# Altium footprint library tianxiaohua_PcbLib.PcbLib: 138 footprints (part 3 of 9)
Each footprint in its own frame and in the unit in brackets; x right, y up, seen from the top. Pads: shape width x height; smd on the part's side, far side on the other; paste and mask are expansions set on the pad; w line width, h text height; cw(c..) or ccw(c..) is an arc to the next point about the centre after c.
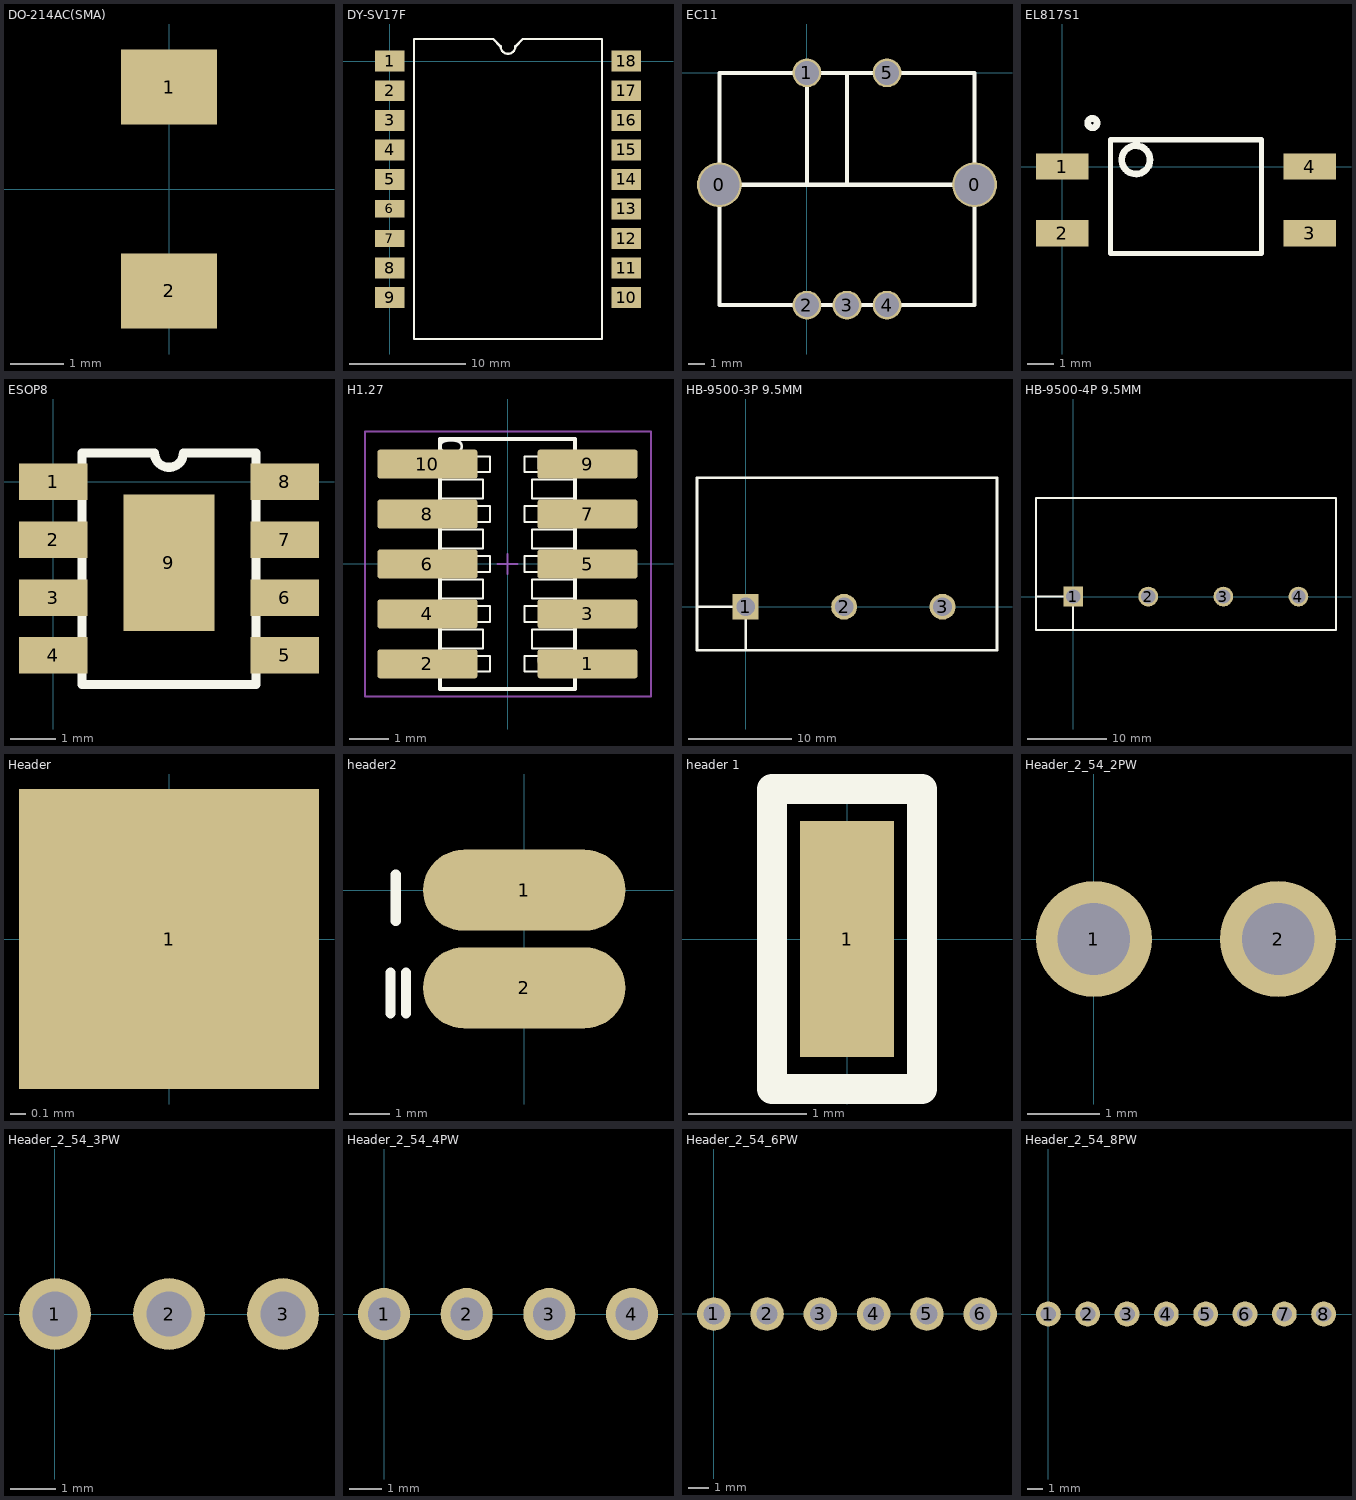
[diagram p2: the footprints below, top view; thin cyan lines are the x and y axes]

## DO-214AC(SMA) [mm]
pads (2):
  rect 1.8x1.4 smd: 1(0,1.905) 2(0,-1.905)
3D body "User Library-DO-214AC SMA.step": height 2.4, standoff 0, extent -1.3,-2.6 1.3,2.6

## DY-SV17F [mm]
pads (18):
  rect 2.5x1.8 smd: 1(0,0) 2(0,-2.54) 3(0,-5.08) 4(0,-7.62) 5(0,-10.16) 8(0,-17.78) 9(0,-20.32) 10(20.32,-20.32) 11(20.32,-17.78) 12(20.32,-15.24) 13(20.32,-12.7) 14(20.32,-10.16) 15(20.32,-7.62) 16(20.32,-5.08) 17(20.32,-2.54) 18(20.32,0)
  rect 2.5x1.5 smd: 6(0,-12.7) 7(0,-15.24)
Top Overlay:
  lines w0.2: 2.085,-23.876 2.085,1.905 8.89,1.905 9.525,1.27 ccw(c10.16,1.27) 10.795,1.27 11.43,1.905 18.235,1.905 18.235,-23.876 2.085,-23.876
3D body: height 2, standoff 0, extent -0.127,-23.876 20.32,2.667

## EC11 [mm]
pads (7):
  round 2.8 hole 2.5: 0(-5.461,-6.985) 0(10.461,-6.985)
  round 1.8 hole 1.5: 1(0,0) 2(0,-14.5) 3(2.5,-14.5) 4(5,-14.5) 5(5,0)
Top Overlay:
  lines w0.254: -5.461,-6.985 2.5,-6.985 ; 0,-6.985 0,0 ; 10.461,-6.985 2.5,-6.985 ; 0,0 -5.461,0 -5.461,-14.5 10.461,-14.5 10.461,0 0,0 ; 0,0 2.5,0 2.5,-6.985
3D body: height 21.5, standoff -2.54, extent -0.058,-9.522 5.011,-4.448
3D body: height 6.7, standoff 0, extent -5.461,-14.5 10.414,0

## EL817S1 [mm]
pads (4):
  rect 2x1 smd: 1(0,0) 2(0,-2.54) 3(9.4,-2.54) 4(9.4,0)
Top Overlay:
  circle w0.254: c1.143,1.651 r0.18
  circle w0.254: c2.794,0.254 r0.539
  lines w0.2: 1.835,-3.302 1.835,1.016 7.565,1.016 7.565,-3.302 1.835,-3.302
3D body: height 3.6, standoff 0, extent 1.651,-3.302 7.747,0.889

## ESOP8 [mm]
pads (9):
  rect 1.5x0.8 smd: 1(0,0) 2(0,-1.27) 3(0,-2.54) 4(0,-3.81) 5(5.081,-3.81) 6(5.081,-2.54) 7(5.081,-1.27) 8(5.081,0)
  rect 2x3 smd: 9(2.54,-1.778)
Top Overlay:
  lines w0.2: 2.159,0.635 0.635,0.635 0.635,-4.445 4.445,-4.445 4.445,0.635 2.921,0.635 ; 2.222,0.635 ccw(c2.54,0.635) 2.857,0.635
3D body "User Library-SOIC_N-R8.STEP": height 1.75, standoff 0, extent -0.56,-4.405 5.64,0.595

## H1.27 [mm]
pads (10):
  rrect20% 2.55x0.74 smd mask+0.051: 1(2.027,-2.542) 2(-2.043,-2.542) 3(2.027,-1.272) 4(-2.043,-1.272) 5(2.027,-0.002) 6(-2.043,-0.002) 7(2.027,1.268) 8(-2.043,1.268) 9(2.027,2.538) 10(-2.043,2.538)
Top Overlay:
  lines w0.05: -1.723,-2.153 -0.628,-2.153 -0.628,-1.672 ; -1.723,-0.883 -0.628,-0.883 -0.628,-0.402 ; -1.723,0.387 -0.628,0.387 -0.628,0.868 ; -1.723,1.657 -0.628,1.657 -0.628,2.138 ; -1.718,-1.662 -0.628,-1.662 ; -1.718,-0.392 -0.628,-0.392 ; -1.718,0.878 -0.628,0.878 ; -1.718,2.148 -0.628,2.148 ; 0.612,-2.153 1.702,-2.153 ; 0.612,-2.143 0.612,-1.662 1.707,-1.662 ; 0.612,-0.883 1.702,-0.883 ; 0.612,-0.873 0.612,-0.392 1.707,-0.392 ; 0.612,0.387 1.702,0.387 ; 0.612,0.397 0.612,0.878 1.707,0.878 ; 0.612,1.657 1.702,1.657 ; 0.612,1.667 0.612,2.148 1.707,2.148 ; -0.848,-2.742 -0.848,-2.342 -0.448,-2.342 -0.448,-2.742 -0.848,-2.742 ; -0.848,-1.472 -0.848,-1.072 -0.448,-1.072 -0.448,-1.472 -0.848,-1.472 ; -0.848,-0.202 -0.448,-0.202 -0.448,0.198 -0.848,0.198 -0.848,-0.202 ; -0.848,1.068 -0.848,1.468 -0.448,1.468 -0.448,1.068 -0.848,1.068 ; -0.848,2.338 -0.848,2.738 -0.448,2.738 -0.448,2.338 -0.848,2.338 ; 0.422,-2.742 0.422,-2.342 0.822,-2.342 0.822,-2.742 0.422,-2.742 ; 0.422,-1.472 0.422,-1.072 0.822,-1.072 0.822,-1.472 0.422,-1.472 ; 0.422,-0.202 0.822,-0.202 0.822,0.198 0.422,0.198 0.422,-0.202 ; 0.422,1.068 0.422,1.468 0.822,1.468 0.822,1.068 0.422,1.068 ; 0.422,2.338 0.422,2.738 0.822,2.738 0.822,2.338 0.422,2.338
  lines w0.1: -1.723,-3.177 -1.723,3.173 1.707,3.173 1.707,-3.177 -1.723,-3.177
  text "10" at -0.958,2.222 h1
  text "5" at 1.542,2.322 h1
  text "2" at -0.933,-2.752 h1
  text "1" at 1.542,-2.702 h1
Mechanical 15:
  lines w0.05: -0.258,-0.002 0.242,-0.002 ; -0.008,-0.252 -0.008,0.248 ; -3.633,-3.377 3.642,-3.377 3.642,3.373 -3.633,3.373 -3.633,-3.377
3D body: height 5.56, standoff 0, extent 0.417,2.338 0.817,2.738
3D body: height 5.56, standoff 0, extent -0.858,2.338 -0.458,2.738
3D body: height 5.56, standoff 0, extent 0.417,-2.742 0.817,-2.342
3D body: height 5.56, standoff 0, extent -0.858,-2.742 -0.458,-2.342
3D body: height 5.56, standoff 0, extent 0.417,-1.472 0.817,-1.072
3D body: height 5.56, standoff 0, extent -0.858,-1.472 -0.458,-1.072
3D body: height 5.56, standoff 0, extent 0.417,1.068 0.817,1.468
3D body: height 5.56, standoff 0, extent -0.858,1.068 -0.458,1.468
3D body: height 5.56, standoff 0, extent -0.858,-0.202 -0.458,0.198
3D body: height 5.56, standoff 0, extent 0.417,-0.202 0.817,0.198
3D body: height 2.51, standoff 0, extent -1.773,-3.237 1.757,3.213

## HB-9500-3P 9.5MM [mm] "接线端子，间距为9.5毫米"
pads (3):
  rect 2.5x2.5 hole 1.8: 1(0,0)
  round 2.5 hole 1.8: 2(9.5,0) 3(19,0)
Top Overlay:
  lines w0.254: -4.699,-4.191 24.257,-4.191 ; -4.699,-4.064 -4.699,12.446 24.257,12.446 24.257,-4.064 ; -4.699,0 0,0 0,-4.191
3D body: height 16.8, standoff 0, extent -4.699,-4.191 24.257,4.826
3D body: height 8, standoff 0, extent -4.699,-4.191 24.384,12.446

## HB-9500-4P 9.5MM [mm] "接线端子，间距9.4毫米，4个接口"
pads (4):
  rect 2.5x2.5 hole 1.8: 1(0,0)
  round 2.5 hole 1.8: 2(9.5,0) 3(19,0) 4(28.5,0)
Top Overlay:
  lines w0.254: -4.699,-4.191 33.25,-4.191 ; -4.699,-4.064 -4.699,12.446 33.25,12.446 33.25,-4.064 ; -4.699,0 0,0 0,-4.191
3D body: height 8, standoff 0, extent -4.699,-4.191 33.274,12.446
3D body: height 16.8, standoff 0.1, extent -4.22,-3.81 32.766,4.826

## Header [mm] "设置其他的引出端口"
pads (1):
  rect 2x2 smd: 1(0,0)

## header2 [mm]
pads (2):
  oval 5x2 smd: 1(0,0) 2(0,-2.413)
Top Overlay:
  lines w0.254: -3.302,-3.048 -3.302,-2.032 ; -3.175,-0.762 -3.175,0.381 ; -2.921,-3.048 -2.921,-2.032

## header 1 [mm]
pads (1):
  rect 0.8x2 smd: 1(0,0)
Top Overlay:
  lines w0.254: -0.635,-1.27 0.635,-1.27 0.635,1.27 -0.635,1.27 -0.635,-1.27

## Header_2_54_2PW [mm] "弯的排针"
pads (2):
  round 1.6 hole 1: 1(0,0) 2(2.54,0)
3D body "HEADER 2_54 HORIZONTAL 2X.step": height 2.75, standoff -1.75, extent -1.27,-10.066 3.81,0.254

## Header_2_54_3PW [mm] "3P弯针"
pads (3):
  round 1.6 hole 1: 1(0,0) 2(2.54,0) 3(5.08,0)
3D body "HEADER 2_54 HORIZONTAL 2X.step": height 2.75, standoff -1.75, extent 1.397,-10.044 6.477,0.276
3D body "HEADER 2_54 HORIZONTAL 2X.step": height 2.75, standoff -1.75, extent -1.27,-10.066 3.81,0.254

## Header_2_54_4PW [mm] "3P弯针"
pads (4):
  round 1.6 hole 1: 1(0,0) 2(2.54,0) 3(5.08,0) 4(7.62,0)
3D body "HEADER 2_54 HORIZONTAL 2X.step": height 2.75, standoff -1.75, extent 3.805,-10.062 8.885,0.258
3D body "HEADER 2_54 HORIZONTAL 2X.step": height 2.75, standoff -1.75, extent -1.27,-10.066 3.81,0.254

## Header_2_54_6PW [mm] "6P弯针"
pads (6):
  round 1.6 hole 1: 1(0,0) 2(2.54,0) 3(5.08,0) 4(7.62,0) 5(10.16,0) 6(12.7,0)
3D body "HEADER 2_54 HORIZONTAL 2X.step": height 2.75, standoff -1.75, extent -1.27,-10.066 3.81,0.254
3D body "HEADER 2_54 HORIZONTAL 2X.step": height 2.75, standoff -1.75, extent 3.81,-10.066 8.89,0.254
3D body "HEADER 2_54 HORIZONTAL 2X.step": height 2.75, standoff -1.75, extent 8.89,-10.066 13.97,0.254

## Header_2_54_8PW [mm] "弯的排针"
pads (8):
  round 1.6 hole 1: 1(0,0) 2(2.54,0) 3(5.08,0) 4(7.62,0) 5(10.16,0) 6(12.7,0) 7(15.24,0) 8(17.78,0)
3D body "HEADER 2_54 HORIZONTAL 2X.step": height 2.75, standoff -1.75, extent -1.27,-10.066 3.81,0.254
3D body "HEADER 2_54 HORIZONTAL 2X.step": height 2.75, standoff -1.75, extent 3.81,-10.066 8.89,0.254
3D body "HEADER 2_54 HORIZONTAL 2X.step": height 2.75, standoff -1.75, extent 8.89,-10.066 13.97,0.254
3D body "HEADER 2_54 HORIZONTAL 2X.step": height 2.75, standoff -1.75, extent 13.97,-10.066 19.05,0.254